# Altium footprint library agh_racing_2018.PcbLib: 166 footprints (part 2 of 11)
Each footprint in its own frame and in the unit in brackets; x right, y up, seen from the top. Pads: shape width x height; smd on the part's side, far side on the other; paste and mask are expansions set on the pad; w line width, h text height; cw(c..) or ccw(c..) is an arc to the next point about the centre after c.
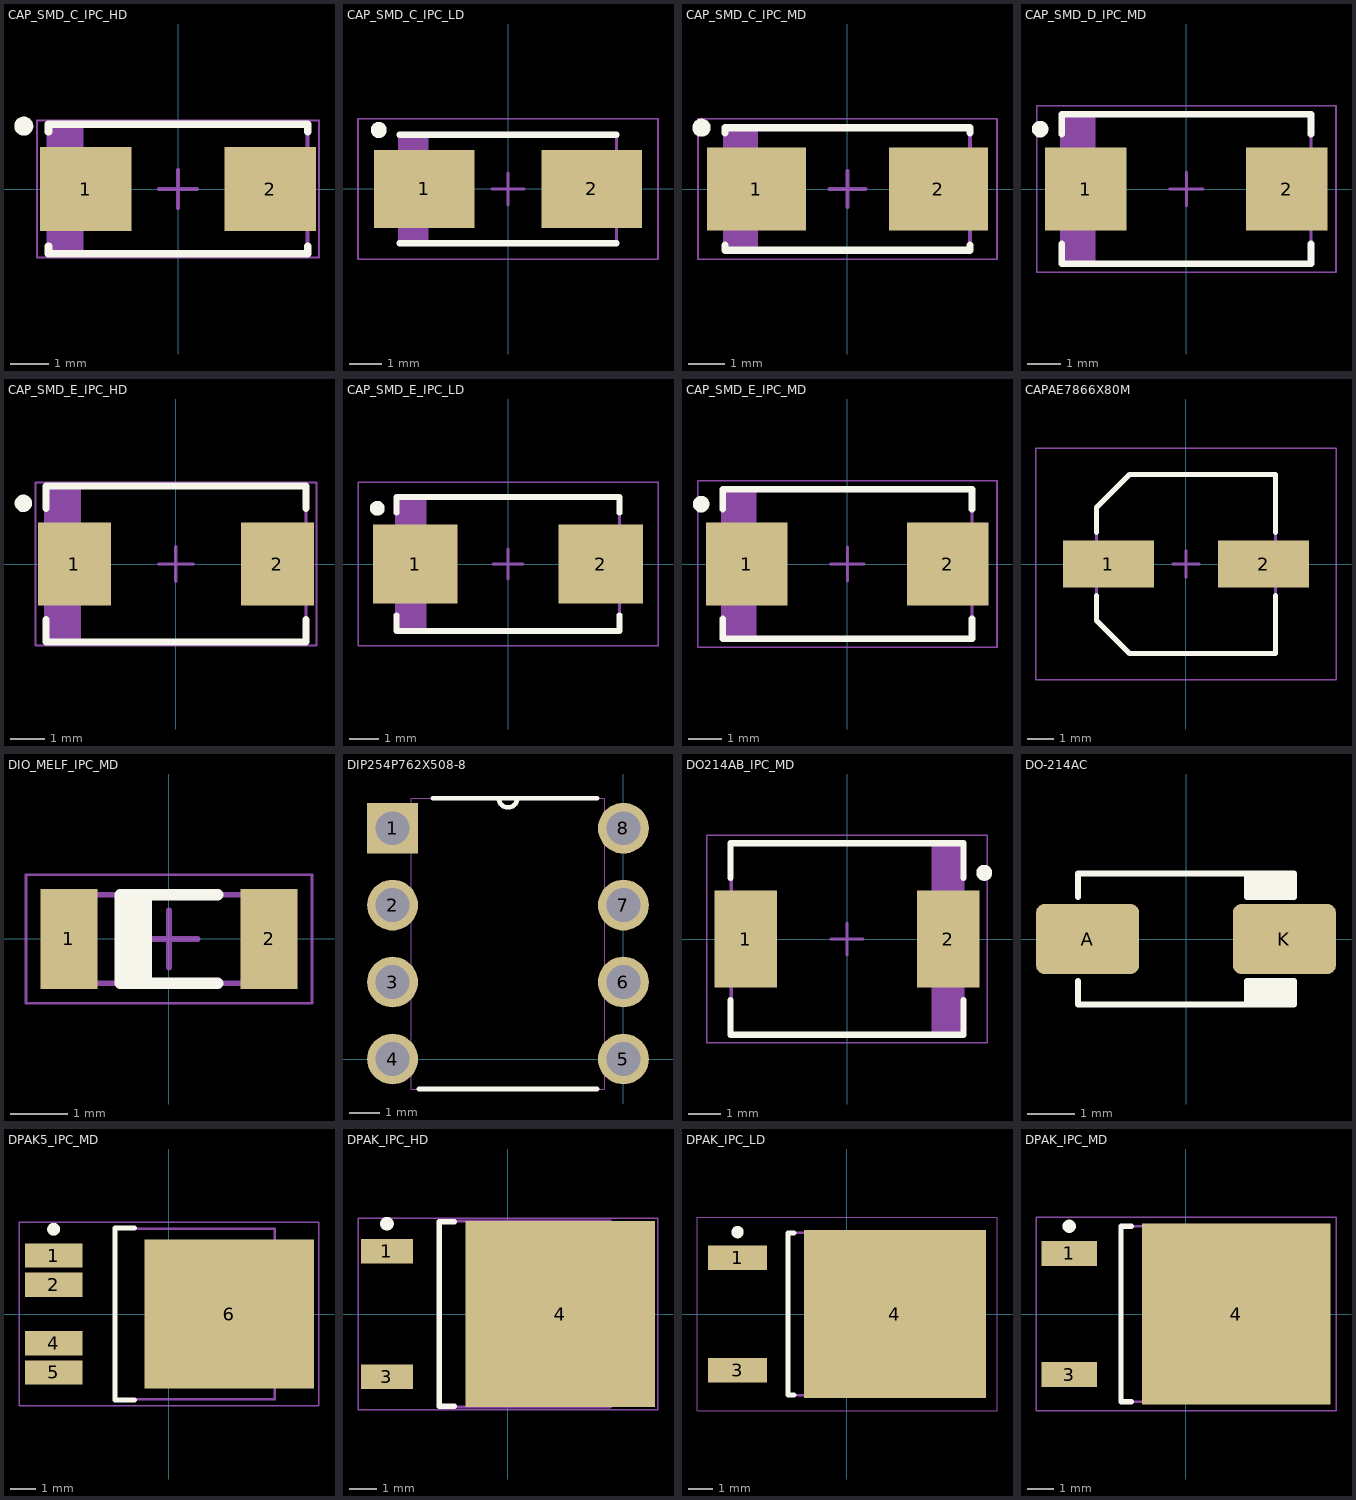
[diagram p1: the footprints below, top view; thin cyan lines are the x and y axes]

## CAP_SMD_C_IPC_HD [mm] "Molded Capacitor, 2-Leads, Body 6.30x3.20mm, IPC High Density"
height 1.8
pads (2):
  rect 2.4x2.2 smd: 1(-2.425,0) 2(2.425,0)
Top Overlay:
  circle w0.25: c-4.05,1.65 r0.125
  lines w0.2: -3.4,-1.5 -3.4,-1.7 3.4,-1.7 3.4,-1.5 ; -3.4,1.5 -3.4,1.7 3.4,1.7 3.4,1.5
Mechanical 13:
  rectangle: -3.4,-1.7 -2.485,1.7
  lines w0.1: -3.4,-1.7 3.4,-1.7 3.4,1.7 -3.4,1.7 -3.4,-1.7
Mechanical 15:
  lines w0.05: -3.7,-1.8 3.7,-1.8 3.7,1.8 -3.7,1.8 -3.7,-1.8
  lines w0.1: -0.5,0 0.5,0 ; 0,-0.5 0,0.5
3D body "CAP_SMD_C_IPC_HD.step": height 1.8, standoff 0, extent -3.62,-1.7 3.62,1.7

## CAP_SMD_C_IPC_LD [mm] "Molded Capacitor, 2-Leads, Body 6.30x3.20mm, IPC Low Density"
height 1.8
pads (2):
  rect 3.15x2.45 smd: 1(-2.625,0) 2(2.625,0)
Top Overlay:
  circle w0.25: c-4.05,1.85 r0.125
  lines w0.2: -3.4,-1.7 3.4,-1.7 ; -3.4,1.7 3.4,1.7
Mechanical 13:
  rectangle: -3.4,-1.7 -2.485,1.7
  lines w0.1: -3.4,-1.7 3.4,-1.7 3.4,1.7 -3.4,1.7 -3.4,-1.7
Mechanical 15:
  lines w0.05: -4.7,-2.2 4.7,-2.2 4.7,2.2 -4.7,2.2 -4.7,-2.2
  lines w0.1: -0.5,0 0.5,0 ; 0,-0.5 0,0.5
3D body "CAP_SMD_C_IPC_LD.step": height 1.8, standoff 0, extent -3.62,-1.7 3.62,1.7

## CAP_SMD_C_IPC_MD [mm] "Molded Capacitor, 2-Leads, Body 6.30x3.20mm, IPC Medium Density"
height 1.8
pads (2):
  rect 2.75x2.3 smd: 1(-2.525,0) 2(2.525,0)
Top Overlay:
  circle w0.25: c-4.05,1.7 r0.125
  lines w0.2: -3.4,-1.55 -3.4,-1.7 3.4,-1.7 3.4,-1.55 ; -3.4,1.55 -3.4,1.7 3.4,1.7 3.4,1.55
Mechanical 13:
  rectangle: -3.4,-1.7 -2.485,1.7
  lines w0.1: -3.4,-1.7 -3.4,1.7 3.4,1.7 3.4,-1.7 -3.4,-1.7
Mechanical 15:
  lines w0.05: -4.15,-1.95 -4.15,1.95 4.15,1.95 4.15,-1.95 -4.15,-1.95
  lines w0.1: -0.5,0 0.5,0 ; 0,-0.5 0,0.5
3D body "CAP_SMD_C_IPC_MD.step": height 1.8, standoff 0, extent -3.62,-1.7 3.62,1.7

## CAP_SMD_D_IPC_MD [mm] "Molded Capacitor, 2-Leads, Body 7.30x4.30mm, IPC Medium Density"
height 3.1
pads (2):
  rect 2.45x2.5 smd: 1(-3.025,0) 2(3.025,0)
Top Overlay:
  circle w0.25: c-4.4,1.8 r0.125
  lines w0.2: -3.75,-1.65 -3.75,-2.25 3.75,-2.25 3.75,-1.65 ; -3.75,1.65 -3.75,2.25 3.75,2.25 3.75,1.65
Mechanical 13:
  rectangle: -3.75,-2.25 -2.741,2.25
  lines w0.1: -3.75,-2.25 3.75,-2.25 3.75,2.25 -3.75,2.25 -3.75,-2.25
Mechanical 15:
  lines w0.05: -4.5,-2.5 4.5,-2.5 4.5,2.5 -4.5,2.5 -4.5,-2.5
  lines w0.1: -0.5,0 0.5,0 ; 0,-0.5 0,0.5
3D body "CAP_SMD_D_IPC_MD.step": height 3.1, standoff 0, extent -3.97,-2.25 3.97,2.25

## CAP_SMD_E_IPC_HD [mm] "Molded Capacitor, 2-Leads, Body 7.30x4.30mm, IPC High Density"
height 4.3
pads (2):
  rect 2.1x2.4 smd: 1(-2.925,0) 2(2.925,0)
Top Overlay:
  circle w0.25: c-4.4,1.75 r0.125
  lines w0.2: -3.75,-1.6 -3.75,-2.25 3.75,-2.25 3.75,-1.6 ; -3.75,1.6 -3.75,2.25 3.75,2.25 3.75,1.6
Mechanical 13:
  rectangle: -3.75,-2.25 -2.741,2.25
  lines w0.1: -3.75,-2.25 3.75,-2.25 3.75,2.25 -3.75,2.25 -3.75,-2.25
Mechanical 15:
  lines w0.05: -4.05,-2.35 4.05,-2.35 4.05,2.35 -4.05,2.35 -4.05,-2.35
  lines w0.1: -0.5,0 0.5,0 ; 0,-0.5 0,0.5
3D body "CAP_SMD_E_IPC_HD.step": height 4.3, standoff 0, extent -3.97,-2.25 3.97,2.25

## CAP_SMD_E_IPC_LD [mm] "Molded Capacitor, 2-Leads, Body 7.30x4.30mm, IPC Low Density"
height 4.3
pads (2):
  rect 2.85x2.65 smd: 1(-3.125,0) 2(3.125,0)
Top Overlay:
  circle w0.25: c-4.4,1.875 r0.125
  lines w0.2: -3.75,-1.725 -3.75,-2.25 3.75,-2.25 3.75,-1.725 ; -3.75,1.725 -3.75,2.25 3.75,2.25 3.75,1.725
Mechanical 13:
  rectangle: -3.75,-2.25 -2.741,2.25
  lines w0.1: -3.75,-2.25 -3.75,2.25 3.75,2.25 3.75,-2.25 -3.75,-2.25
Mechanical 15:
  lines w0.05: -5.05,-2.75 -5.05,2.75 5.05,2.75 5.05,-2.75 -5.05,-2.75
  lines w0.1: -0.5,0 0.5,0 ; 0,-0.5 0,0.5
3D body "CAP_SMD_E_IPC_LD.step": height 4.3, standoff 0, extent -3.97,-2.25 3.97,2.25

## CAP_SMD_E_IPC_MD [mm] "Molded Capacitor, 2-Leads, Body 7.30x4.30mm, IPC Medium Density"
height 4.3
pads (2):
  rect 2.45x2.5 smd: 1(-3.025,0) 2(3.025,0)
Top Overlay:
  circle w0.25: c-4.4,1.8 r0.125
  lines w0.2: -3.75,-1.65 -3.75,-2.25 3.75,-2.25 3.75,-1.65 ; -3.75,1.65 -3.75,2.25 3.75,2.25 3.75,1.65
Mechanical 13:
  rectangle: -3.75,-2.25 -2.741,2.25
  lines w0.1: -3.75,-2.25 -3.75,2.25 3.75,2.25 3.75,-2.25 -3.75,-2.25
Mechanical 15:
  lines w0.05: -4.5,-2.5 -4.5,2.5 4.5,2.5 4.5,-2.5 -4.5,-2.5
  lines w0.1: -0.5,0 0.5,0 ; 0,-0.5 0,0.5
3D body "CAP_SMD_E_IPC_MD.step": height 4.3, standoff 0, extent -3.97,-2.25 3.97,2.25

## CAPAE7866X80M [mm] "Aluminum Electrolytic Capacitor, Body 6,60x6,60x8,00mm, IPC Low Density"
height 8
pads (2):
  rect 3.45x1.8 smd: 1(-2.95,0) 2(2.95,0)
Top Overlay:
  lines w0.2: -3.4,-1.2 -3.4,-2.15 -2.15,-3.4 3.4,-3.4 3.4,-1.2 ; -3.4,1.2 -3.4,2.15 -2.15,3.4 3.4,3.4 3.4,1.2
Mechanical 13:
  lines w0.1: -3.4,-2.15 -2.15,-3.4 3.4,-3.4 3.4,3.4 -2.15,3.4 -3.4,2.15 -3.4,-2.15
Mechanical 15:
  lines w0.05: -5.7,-4.4 -5.7,4.4 5.7,4.4 5.7,-4.4 -5.7,-4.4
  lines w0.1: -0.5,0 0.5,0 ; 0,-0.5 0,0.5
3D body "CAPAE7866X80M.step": height 8, standoff 0, extent -3.9,-3.4 3.9,3.4

## DIO_MELF_IPC_MD [mm] "MELF Diode, 2-Leads, Body 3.50x1.53mm, IPC MD"
height 1.55
pads (2):
  rect 1x1.75 smd: 1(-1.75,0) 2(1.75,0)
Top Overlay:
  rectangle: -0.85,-0.775 -0.3,0.775
  lines w0.2: 0.85,-0.775 -0.85,-0.775 -0.85,0.775 0.85,0.775
Mechanical 13:
  lines w0.1: -1.85,-0.775 1.85,-0.775 1.85,0.775 -1.85,0.775 -1.85,-0.775
Mechanical 15:
  lines w0.05: -2.5,-1.125 2.5,-1.125 2.5,1.125 -2.5,1.125 -2.5,-1.125
  lines w0.1: -0.5,0 0.5,0 ; 0,-0.5 0,0.5
3D body "DIO_SMALL_IPC_MD.step": height 1.53, standoff 0, extent -1.75,-0.762 1.75,0.762

## DIP254P762X508-8 [mil]
pads (8):
  rect 66x66 hole 44: 1(-300,300)
  round 66 hole 44: 2(-300,200) 3(-300,100) 4(-300,0) 5(0,0) 6(0,100) 7(0,200) 8(0,300)
Top Overlay:
  lines w6: -266,-39 -34,-39 ; -248,339 -162,339 ; -34,339 -138,339 ; -162,339 ccw(c-150,339) -138,339 ; -162,339 -138,339
Mechanical 1:
  lines w0: -162,339 ccw(c-150,339) -138,339 ; -162,339 -138,339 ; -162,339 -276,339 -276,-39 -24,-39 -24,339 -138,339 ; -322,-22 -322,22 -276,22 -276,-22 -322,-22 ; -322,78 -322,122 -276,122 -276,78 -322,78 ; -322,178 -322,222 -276,222 -276,178 -322,178 ; -322,278 -322,322 -276,322 -276,278 -322,278 ; -24,-22 -24,22 22,22 22,-22 -24,-22 ; -24,78 -24,122 22,122 22,78 -24,78 ; -24,178 -24,222 22,222 22,178 -24,178 ; -24,278 -24,322 22,322 22,278 -24,278

## DO214AB_IPC_MD [mm] "Molded Diode, DO214AB, Diotec Semiconductor, IPC Medium Density"
height 2.5
pads (2):
  rect 1.95x3.05 smd: 1(-3.175,0) 2(3.175,0)
Top Overlay:
  circle w0.25: c4.3,2.075 r0.125
  lines w0.2: -3.65,-1.925 -3.65,-3 3.65,-3 3.65,-1.925 ; -3.65,1.925 -3.65,3 3.65,3 3.65,1.925
Mechanical 13:
  rectangle: 2.65,-3 3.625,3
  lines w0.1: -3.625,-3 3.625,-3 3.625,3 -3.625,3 -3.625,-3
Mechanical 15:
  lines w0.05: -4.4,-3.25 4.4,-3.25 4.4,3.25 -4.4,3.25 -4.4,-3.25
  lines w0.1: -0.5,0 0.5,0 ; 0,-0.5 0,0.5
3D body "DO214AB_IPC_MD.step": height 2.5, standoff 0, extent -3.845,-3 3.845,3

## DO-214AC [mm] "JEDEC DO214 variation AC. SMA"
height 2.5
pads (2):
  rrect25% 2.2x1.5 smd: A(-2.1,0) K(2.1,0)
Top Overlay:
  rectangle: 1.3,0.9 2.3,1.4
  rectangle: 1.3,-1.4 2.3,-0.9
  lines w0.127: -2.3,-0.9 -2.3,-1.4 2.3,-1.4 2.3,-0.9 1.3,-0.9 1.3,-1.4 ; -2.3,0.9 -2.3,1.4 2.3,1.4 2.3,0.9 1.3,0.9 ; 1.3,0.911 1.3,1.4
3D body "SW3dPS-DO-214AC SMA.STEP": height 2.42, standoff 0.02, extent -2.6,-1.3 2.6,1.3

## DPAK5_IPC_MD [mm] "D-PAK, 5-Pads, Body 6,2x6,7mm, IPC Medium Density"
height 2.35
pads (5):
  rect 2.25x0.95 smd: 1(-4.5,2.28) 2(-4.5,1.14) 4(-4.5,-1.14) 5(-4.5,-2.28)
  rect 6.6x5.8 smd: 6(2.35,0)
Top Overlay:
  circle w0.25: c-4.5,3.305 r0.125
  lines w0.2: -1.35,-3.35 -2.1,-3.35 -2.1,3.35 -1.35,3.35
Mechanical 13:
  lines w0.1: -2.1,-3.325 4.12,-3.325 4.12,3.325 -2.1,3.325 -2.1,-3.325
Mechanical 15:
  lines w0.05: -5.85,-3.575 5.85,-3.575 5.85,3.575 -5.85,3.575 -5.85,-3.575
  lines w0.1: -0.5,0 0.5,0 ; 0,-0.5 0,0.5
3D body "DPAK5_IPC_MD.step": height 2.35, standoff 0, extent -4.46,-3.325 5.52,3.325

## DPAK_IPC_HD [mm] "D-PAK, 3-Pads, Body 6.21x6.73mm (max), IPC High Density"
height 2.38
pads (3):
  rect 1.9x0.9 smd: 1(-4.4,2.28) 3(-4.4,-2.28)
  rect 6.9x6.75 smd: 4(1.9,0)
Top Overlay:
  circle w0.25: c-4.4,3.28 r0.125
  lines w0.2: -1.95,-3.35 -2.5,-3.35 -2.5,3.35 -1.95,3.35
Mechanical 13:
  lines w0.1: -2.5,-3.375 -2.5,3.375 3.72,3.375 3.72,-3.375 -2.5,-3.375
Mechanical 15:
  lines w0.05: -5.45,-3.475 -5.45,3.475 5.45,3.475 5.45,-3.475 -5.45,-3.475
  lines w0.1: -0.5,0 0.5,0 ; 0,-0.5 0,0.5
3D body "DPAK_IPC_HD.step": height 2.51, standoff 0, extent -4.7,-3.375 5.205,3.375

## DPAK_IPC_LD [mm]
height 2.4
pads (3):
  rect 2.4x1 smd: 1(-4.45,2.28) 3(-4.45,-2.28)
  rect 7.4x6.85 smd: 4(1.95,0)
Top Overlay:
  circle w0.25: c-4.45,3.33 r0.125
  lines w0.2: -2.15,-3.3 -2.4,-3.3 -2.4,3.3 -2.15,3.3
Mechanical 13:
  lines w0.1: -2.4,-3.3 -2.4,3.3 3.8,3.3 3.8,-3.3 -2.4,-3.3
Mechanical 15:
  lines w0.05: -6.1,-3.925 -6.1,3.925 6.1,3.925 6.1,-3.925 -6.1,-3.925
  lines w0.1: -0.5,0 0.5,0 ; 0,-0.5 0,0.5
3D body "DPAK_IPC_LD.step": height 2.63, standoff 0, extent -4.34,-3.3 5.385,3.3

## DPAK_IPC_MD [mm] "D-PAK, 3-Pads, Body 6.20x6.66mm (max), IPC Medium Density"
height 2.4
pads (3):
  rect 2.1x0.95 smd: 1(-4.4,2.28) 3(-4.4,-2.28)
  rect 7.1x6.8 smd: 4(1.9,0)
Top Overlay:
  circle w0.25: c-4.4,3.305 r0.125
  lines w0.2: -2.05,-3.3 -2.45,-3.3 -2.45,3.3 -2.05,3.3
Mechanical 13:
  lines w0.1: -2.45,-3.3 3.75,-3.3 3.75,3.3 -2.45,3.3 -2.45,-3.3
Mechanical 15:
  lines w0.05: -5.65,-3.65 5.65,-3.65 5.65,3.65 -5.65,3.65 -5.65,-3.65
  lines w0.1: -0.5,0 0.5,0 ; 0,-0.5 0,0.5
3D body "DPAK_IPC_MD.step": height 2.63, standoff 0, extent -4.44,-3.3 5.285,3.3